# Altium footprint library Mechanical_Old.PcbLib: 125 footprints (part 6 of 8)
Each footprint in its own frame and in the unit in brackets; x right, y up, seen from the top. Pads: shape width x height; smd on the part's side, far side on the other; paste and mask are expansions set on the pad; w line width, h text height; cw(c..) or ccw(c..) is an arc to the next point about the centre after c.
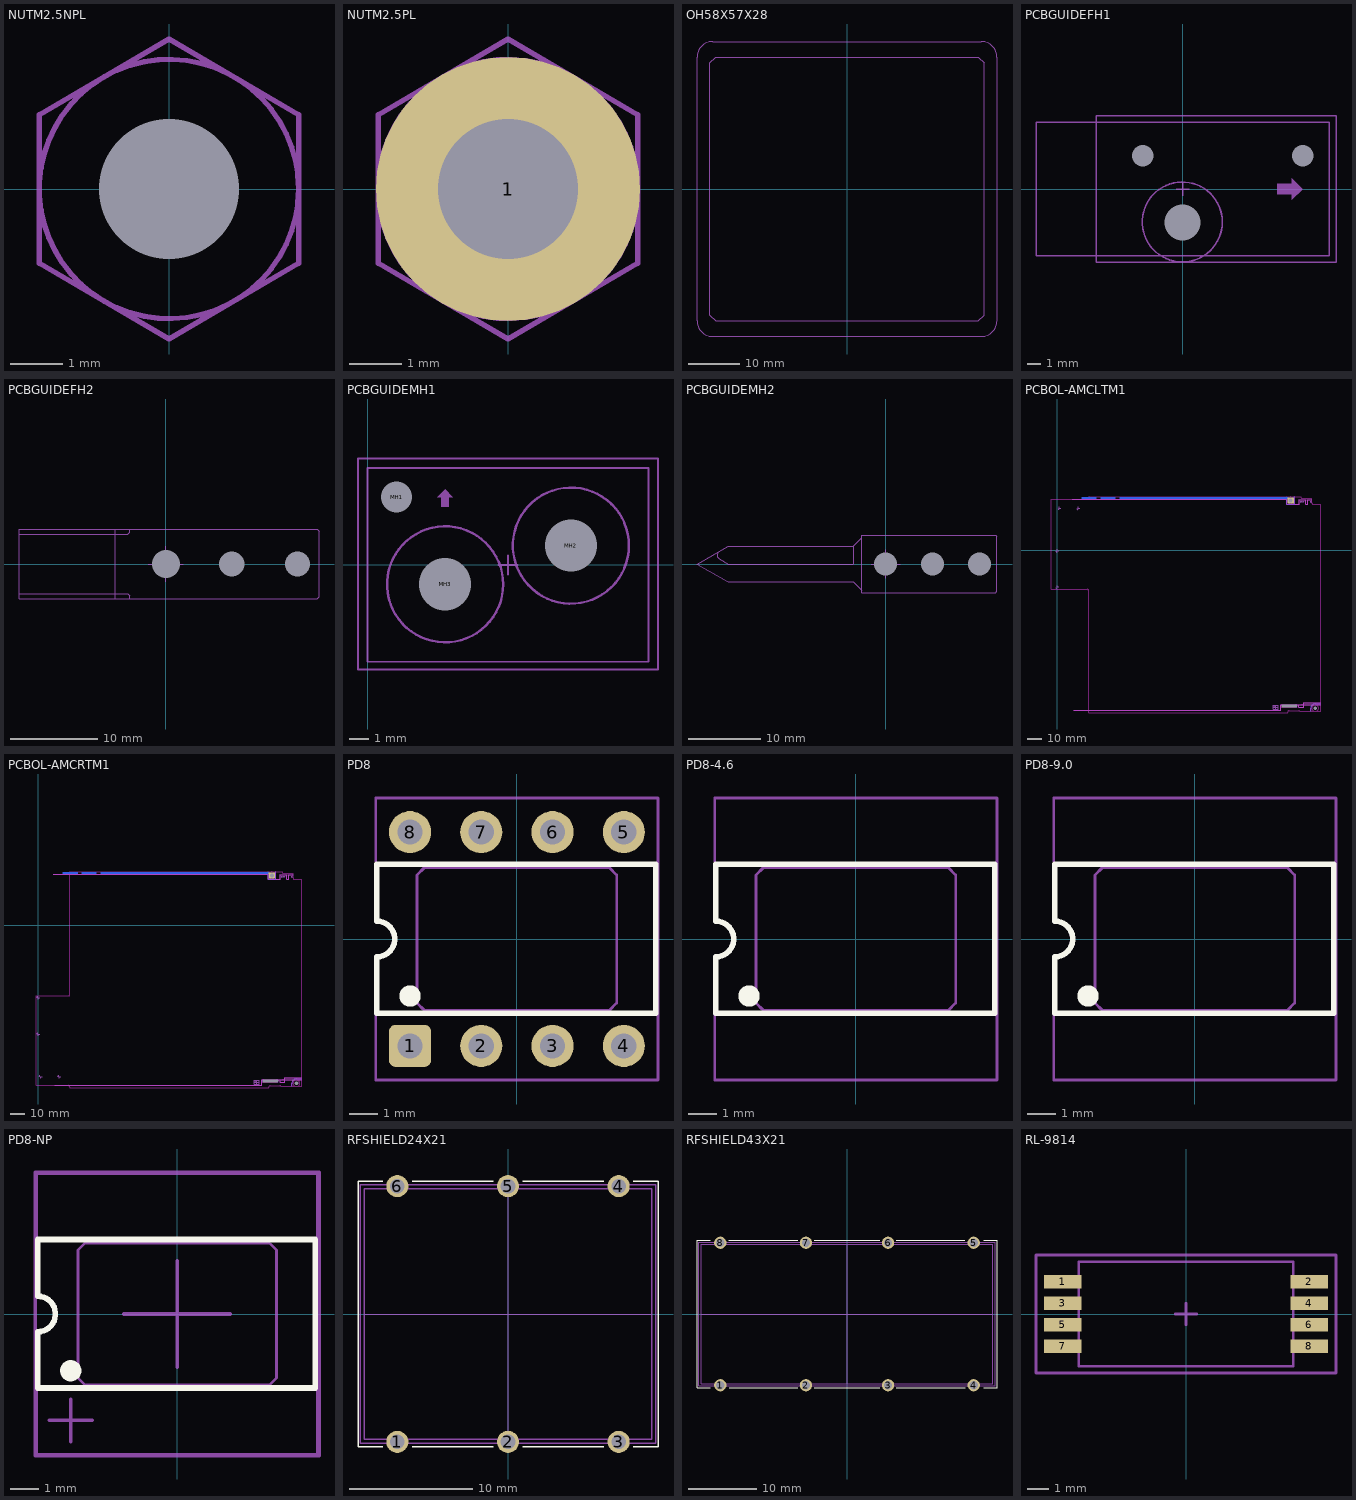
[diagram p5: the footprints below, top view; thin cyan lines are the x and y axes]

## NUTM2.5NPL [mm] "Nut M2.5 NON plated hole"
height 2
pads (1):
  round 0 hole 2.7 unplated mask+2.9: 1(0,0)
Mechanical 13:
  circle w0.102: c0,0 r2.5
  circle w0.102: c0,0 r1.25
  lines w0.102: -2.5,-1.432 -2.5,1.432 0,2.893 2.5,1.432 2.5,-1.432 0,-2.893 -2.5,-1.432
3D body: height 2, standoff 0, extent -2.5,-2.893 2.5,2.893

## NUTM2.5PL [mm] "Nut M2.5 plated hole"
height 2
pads (1):
  round 5.1 hole 2.7 mask+0.2: 1(0,0)
Mechanical 13:
  circle w0.102: c0,0 r2.5
  circle w0.102: c0,0 r1.25
  lines w0.102: -2.5,-1.432 -2.5,1.432 0,2.893 2.5,1.432 2.5,-1.432 0,-2.893 -2.5,-1.432
3D body: height 2, standoff 0, extent -2.5,-2.893 2.5,2.893

## OH58X57X28 [mm] "OH58X57X28 ABS"
height 28
Mechanical 2:
  lines w0.1: -26.5,-24.4 -26.5,24.4 -25.4,25.5 25.4,25.5 26.5,24.4 26.5,-24.4 25.4,-25.5 -25.4,-25.5 -26.5,-24.4
  lines w0.15: -29,-25.5 ccw(c-26,-25.5) -26,-28.5 26,-28.5 ccw(c26,-25.5) 29,-25.5 29,25.5 ccw(c26,25.5) 26,28.5 -26,28.5 ccw(c-26,25.5) -29,25.5 -29,-25.5

## PCBGUIDEFH1 [mm] "PCB guide female horizontal two pins"
height 14.5
pads (3):
  round 0.7 hole 1.6 unplated: MH1(-3,2.5) MH2(9,2.5)
  round 0 hole 2.7 unplated mask+3: MH3(0,-2.5)
Mechanical 13:
  region: 7.1,0.4 8.2,0.4 8.2,0.8 9,0 8.2,-0.8 8.2,-0.4 7.1,-0.4
  lines w0.102: -11,-5 -11,5 11,5 11,-5 -11,-5
Mechanical 15:
  circle w0.127: c-0.025,-2.475 r3
  lines w0.102: -0.5,0 0.5,0 ; 0,-0.5 0,0.5 ; -6.5,-5.5 -6.5,5.5 11.5,5.5 11.5,-5.5 -6.5,-5.5
3D body: height 14.51, standoff 14.5, extent 7.1,-0.8 9,0.8

## PCBGUIDEFH2 [mm] "PCB guide female horizontal one pin"
height 14.5
pads (3):
  round 0.7 hole 3.2 unplated: MH1(0,0)
  round 0.7 hole 2.9 unplated: MH2(15,0) MH3(7.5,0)
Mechanical 13:
  lines w0.1: -16.75,-3.4 -4.325,-3.4 -4.125,-3.6 -4.125,-3.95 ; -16.75,3.4 -4.325,3.4 -4.125,3.6 -4.125,3.95
  lines w0.102: -16.75,-3.95 17.25,-3.95 17.45,-3.75 17.45,3.75 17.25,3.95 -16.75,3.95 -16.75,-3.95
Mechanical 15:
  lines w0.1: -5.75,-3.95 -5.75,3.95
  lines w0.102: -2,0 2,0 ; 0,-2 0,2
3D body: height 9.72, standoff -1.98, extent -16.75,-3.95 17.45,3.95

## PCBGUIDEMH1 [mm] "PCB guide male vertical"
height 14.5
pads (3):
  round 0.7 hole 1.6 unplated: MH1(1.5,3.5)
  round 0.7 hole 2.7 unplated mask+3: MH2(10.5,1) MH3(4,-1)
Mechanical 13:
  region: 3.8,3 3.8,3.5 3.6,3.5 4,3.9 4.4,3.5 4.2,3.5 4.2,3
  lines w0.102: 0,-5 0,5 14.5,5 14.5,-5 0,-5
Mechanical 15:
  circle w0.127: c10.5,1 r3
  circle w0.127: c4,-1 r3
  lines w0.102: 6.75,0 7.75,0 ; 7.25,-0.5 7.25,0.5 ; -0.5,-5.4 15,-5.4 15,5.5 -0.5,5.5 -0.5,-5.4
3D body: height 0, standoff -2.5, extent 9.19,-0.314 11.812,2.309
3D body: height 0, standoff -2.5, extent 0.698,2.686 2.311,4.3
3D body: height 29.5, standoff 8.57, extent 8.988,-0.513 12.012,1.606
3D body: height 29.5, standoff 8.57, extent 2.488,-2.513 5.512,-0.394
3D body: height 8.57, standoff 7, extent 1.483,-3.491 6.507,1.534
3D body: height 8.57, standoff 7, extent 7.983,-1.491 13.007,3.534
3D body: height 7, standoff 0, extent 0,-5 14.5,5
3D body: height 7.01, standoff 7, extent 3.6,3 4.4,3.9

## PCBGUIDEMH2 [mm] "PCB guide male horizontal one pin"
height 14.5
pads (3):
  round 0.7 hole 3.2 unplated: MH1(0,0) MH2(12.96,0) MH3(6.48,0)
Mechanical 13:
  lines w0.1: -23.029,1.682 ccw(c-22.725,1.2) -23.01,0.707 -21.75,0 -4.475,0 -4.475,2.425 ; -3.3,-3.6 -4.475,-2.425 -21.75,-2.425 -26.075,0 -21.75,2.425 -4.475,2.425 ; -3.3,3.6 -4.475,2.425
  lines w0.102: -3.3,-3.95 -3.3,3.95 15.2,3.95 15.4,3.75 15.4,-3.75 15.2,-3.95 -3.3,-3.95
Mechanical 15:
  lines w0.1: -3.3,-3.95 -3.3,3.95
  lines w0.102: -2,0 2,0 ; 0,-2 0,2
3D body: height 9.72, standoff -3.98, extent -26.07,-3.95 15.4,3.95

## PCBOL-AMCLTM1 [mm] "AMC LTM module outline"
pads (11):
  oval 11x2 on Top Solder: 1(159.4,-106.95)
  oval 11x2 on Bottom Solder: 2(159.4,-106.95)
  rect 10x1 smd far side paste-3 mask-3: EP1(21.9,35.95) EP1(21.9,35.95) EP2(34.9,35.95) EP2(34.9,35.95)
  rect 115.5x1 smd far side paste-3 mask-3: EP3(100.65,35.95) EP3(100.65,35.95)
  rect 4.7x4.4 / inner round 0 / far side rect 4.7x4.4 hole 2.7 copper offset 0,-0.15 paste-2.54 mask+0.254: EP3(160.4,34.4)
  round 0 hole 2.7 unplated paste-2.54 mask+1.8: MH2(177.25,-108.5)
  round 0 hole 1.6 slot 10.6 at 0 deg unplated: MH3(159.4,-106.95)
Top Layer keep-out:
  lines w0.1: 157.8,36.75 157.8,31.8 166.2,31.8 166.2,34.9 175,34.9 ; 174.35,-110.65 174.35,-108.501 ; 176.065,-105.85 181,-105.85
  lines w0.102: 174.353,-108.494 cw(c177.26,-108.501) 176.065,-105.851
Bottom Layer keep-out:
  lines w0.1: 157.8,36.75 157.8,31.8 163.025,31.8 163.025,36.75
  lines w0.102: 174.25,-110.65 174.25,-108.493 cw(c177.25,-108.5) 177.25,-105.5 181,-105.5
Top Solder:
  region: 158.4,-110.1 11,-110.1 11,-111.9 158.4,-111.9
  region: 157.875,36.9 10.2,36.9 10.2,35.1 157.875,35.1
Bottom Solder:
  region: 157.875,36.9 10.2,36.9 10.2,35.1 157.875,35.1
  region: 158.4,-110.1 11,-110.1 11,-111.9 158.4,-111.9
Keep-Out Layer:
  lines w0.1: 20.5,-26.65 cw(c20.5,-27.65) 21.5,-27.65 ; 167.4,36.75 22,36.75 ccw(c22,36.25) 21.5,36.25 21.5,36 cw(c20.5,36) 20.5,35 -4.1,35 -4.1,-26.65 21.5,-26.65 21.5,-111.75 158.4,-111.75 158.4,-111.15 cw(c159.4,-111.15) 159.4,-110.15 165.784,-110.15 cw(c165.784,-111.15) 166.65,-110.65 181,-110.65 181,31.55 176,31.55 cw(c176,32.55) 175,32.55 175,35.75 168.4,35.75
Keep-Out Layer:
  circle w0.1: c160.4,34.4 r2.3
  lines w0.1: 167.4,36.75 ccw(c168.4,36.75) 168.4,35.75 ; 176.426,-110.647 cw(c177.25,-108.5) 178.074,-110.647 ; 154.4,-107.95 cw(c154.4,-106.95) 154.4,-105.95 163.9,-105.95 cw(c163.9,-106.95) 163.9,-107.95 154.4,-107.95
Mechanical 13 keep-out:
  lines w0.1: 10.2,35 157.8,35 157.8,31.8 166.2,31.8 166.2,34.9 170.8,34.9 170.8,31.8 172.1,31.8 172.1,34.9 175,34.9 ; 11.2,-110 153.4,-110 153.4,-106.55 154,-105.95 181,-105.95
Mechanical 14 keep-out:
  lines w0.1: 10.2,35 157.8,35 157.8,31.8 163,31.8 163,36.75 ; 11.2,-110 153.4,-110 153.4,-106.55 154,-105.95 166.05,-105.95 166.05,-107.975 169.2,-107.975 169.2,-104.8
  lines w0.102: 169.2,-104.8 181,-104.8
Mechanical 15:
  lines w0.1: 0,-24.15 0,-25.15 1,-25.15 ; 0,0.85 0,-0.15 1,-0.15 ; 1.5,30 1.5,29 2.5,29 ; 14.46,30 14.46,29 15.46,29 ; 150,-109.1 150,-106.3 148.25,-107.7 151.75,-107.7 ; 167.3,33.75 167.3,32.95 166.9,33.35 169.4,33.35 169,33.75 169,32.95 ; 168.15,32.95 168.15,33.75 ; 168.167,-106.4 168.167,-105.6 167.767,-106 168.567,-106 ; 174.25,33.725 174.25,32.925 173.85,33.325 174.65,33.325 ; -1,-25.55 -0.4,-25.55 -0.4,-26.15 -1,-25.55 ; -1,-25.55 -1,-25.55 ; -1,-0.55 -0.4,-1.15 -0.4,-0.55 -1,-0.55 ; -1,-0.55 -1,-0.55 ; 0.5,28.6 1.1,28.6 1.1,28 0.5,28.6 ; 0.5,28.6 0.5,28.6 ; 13.45,28.6 14.05,28.6 14.05,28 13.45,28.6 ; 13.45,28.6 13.45,28.6 ; 148.25,-109.1 148.25,-106.3 151.75,-106.3 151.75,-109.1 148.25,-109.1

## PCBOL-AMCRTM1 [mm] "AMC RTM module outline"
pads (11):
  oval 11x2 on Top Solder: 1(159.4,-106.95)
  oval 11x2 on Bottom Solder: 2(159.4,-106.95)
  rect 10x1 smd far side paste-3 mask-3: EP1(21.9,35.95) EP1(21.9,35.95) EP2(34.9,35.95) EP2(34.9,35.95)
  rect 115.5x1 smd far side paste-3 mask-3: EP3(100.65,35.95) EP3(100.65,35.95)
  rect 4.7x4.4 / inner round 0 / far side rect 4.7x4.4 hole 2.7 copper offset 0,-0.15 paste-2.54 mask+0.254: EP3(160.4,34.4)
  round 0 hole 2.7 unplated paste-2.54 mask+1.8: MH2(177.25,-108.5)
  round 0 hole 1.6 slot 10.6 at 0 deg unplated: MH3(159.4,-106.95)
Top Layer keep-out:
  lines w0.1: 157.8,36.75 157.8,31.8 166.2,31.8 166.2,34.9 175,34.9 ; 174.35,-110.65 174.35,-108.501 ; 176.065,-105.85 181,-105.85
  lines w0.102: 174.353,-108.494 cw(c177.26,-108.501) 176.065,-105.851
Bottom Layer keep-out:
  lines w0.1: 157.8,36.75 157.8,31.8 163.025,31.8 163.025,36.75
  lines w0.102: 174.25,-110.65 174.25,-108.493 cw(c177.25,-108.5) 177.25,-105.5 181,-105.5
Top Solder:
  region: 158.4,-110.1 11,-110.1 11,-111.9 158.4,-111.9
  region: 157.875,36.9 10.2,36.9 10.2,35.1 157.875,35.1
Bottom Solder:
  region: 157.875,36.9 10.2,36.9 10.2,35.1 157.875,35.1
  region: 158.4,-110.1 11,-110.1 11,-111.9 158.4,-111.9
Keep-Out Layer:
  lines w0.1: 20.5,-48.35 ccw(c20.5,-47.35) 21.5,-47.35 ; 167.4,36.75 21.5,36.75 21.5,-48.35 -1.5,-48.35 -1.5,-110 20.5,-110 cw(c20.5,-111) 21.5,-111 21.5,-111.25 ccw(c22,-111.25) 22,-111.75 158.4,-111.75 158.4,-111.15 cw(c159.4,-111.15) 159.4,-110.15 165.784,-110.15 cw(c165.784,-111.15) 166.65,-110.65 181,-110.65 181,31.55 176,31.55 cw(c176,32.55) 175,32.55 175,35.75 168.4,35.75
Keep-Out Layer:
  circle w0.1: c160.4,34.4 r2.3
  lines w0.1: 167.4,36.75 ccw(c168.4,36.75) 168.4,35.75 ; 176.426,-110.647 cw(c177.25,-108.5) 178.074,-110.647 ; 154.4,-107.95 cw(c154.4,-106.95) 154.4,-105.95 163.9,-105.95 cw(c163.9,-106.95) 163.9,-107.95 154.4,-107.95
Mechanical 13 keep-out:
  lines w0.1: 10.2,35 157.8,35 157.8,31.8 166.2,31.8 166.2,34.9 170.8,34.9 170.8,31.8 172.1,31.8 172.1,34.9 175,34.9 ; 11.2,-110 153.4,-110 153.4,-106.55 154,-105.95 181,-105.95
Mechanical 14 keep-out:
  lines w0.1: 10.2,35 157.8,35 157.8,31.8 163,31.8 163,36.75 ; 11.2,-110 153.4,-110 153.4,-106.55 154,-105.95 166.05,-105.95 166.05,-107.975 169.2,-107.975 169.2,-104.8
  lines w0.102: 169.2,-104.8 181,-104.8
Mechanical 15:
  lines w0.1: 0,-75.85 0,-74.85 1,-74.85 ; 0,-50.85 0,-49.85 1,-49.85 ; 1.5,-105 1.5,-104 2.5,-104 ; 14.46,-105 14.46,-104 15.46,-104 ; 150,-109.1 150,-106.3 148.25,-107.7 151.75,-107.7 ; 167.3,33.75 167.3,32.95 166.9,33.35 169.4,33.35 169,33.75 169,32.95 ; 168.15,32.95 168.15,33.75 ; 168.167,-106.4 168.167,-105.6 167.767,-106 168.567,-106 ; 174.25,33.725 174.25,32.925 173.85,33.325 174.65,33.325 ; -1,-74.45 -0.4,-73.85 -0.4,-74.45 -1,-74.45 ; -1,-74.45 -1,-74.45 ; -1,-49.45 -0.4,-49.45 -0.4,-48.85 -1,-49.45 ; -1,-49.45 -1,-49.45 ; 0.5,-103.6 1.1,-103.6 1.1,-103 0.5,-103.6 ; 0.5,-103.6 0.5,-103.6 ; 13.45,-103.6 14.05,-103.6 14.05,-103 13.45,-103.6 ; 13.45,-103.6 13.45,-103.6 ; 148.25,-109.1 148.25,-106.3 151.75,-106.3 151.75,-109.1 148.25,-109.1

## PD8 [mm] "DIL Socket 8pin E=7.62mm R2.54 mm"
height 2.5
pads (8):
  rrect30% 1.5x1.5 hole 0.9: 1(-3.81,-3.81)
  round 1.5 hole 0.9: 2(-1.27,-3.81) 3(1.27,-3.81) 4(3.81,-3.81) 5(3.81,3.81) 6(1.27,3.81) 7(-1.27,3.81) 8(-3.81,3.81)
Top Overlay:
  circle w0.4: c-3.81,-2.032 r0.18
  lines w0.2: -4.992,2.65 -4.992,0.635 cw(c-4.992,0) -4.992,-0.635 -4.992,-2.65 4.953,-2.65 4.953,2.667 -4.992,2.667
Mechanical 13:
  lines w0.1: -5.029,-5.029 -5.029,-0.635 ccw(c-5.029,0) -5.029,0.635 -5.029,5.029 5.029,5.029 5.029,-5.029 -5.029,-5.029 ; -3.556,-2.286 -3.302,-2.54 3.302,-2.54 3.556,-2.286 3.556,2.286 3.302,2.54 -3.302,2.54 -3.556,2.286 -3.556,-2.286
3D body: height 2.5, standoff 0.5, extent -5.029,-5.029 5.029,5.029
3D body: height 2.55, standoff 0, extent -4.826,-4.826 -2.802,-2.798
3D body: height 2.55, standoff 0, extent -2.286,-4.826 -0.262,-2.798
3D body: height 2.55, standoff 0, extent 0.254,-4.826 2.278,-2.798
3D body: height 2.55, standoff 0, extent 2.794,-4.826 4.818,-2.798
3D body: height 2.55, standoff 0, extent 2.802,2.798 4.826,4.826
3D body: height 2.55, standoff 0, extent 0.262,2.798 2.286,4.826
3D body: height 2.55, standoff 0, extent -2.278,2.798 -0.254,4.826
3D body: height 2.55, standoff 0, extent -4.818,2.798 -2.794,4.826
3D body: height 0, standoff -3, extent -4.191,-4.191 -3.432,-3.431
3D body: height 0, standoff -3, extent -1.651,-4.191 -0.892,-3.431
3D body: height 0, standoff -3, extent 0.889,-4.191 1.648,-3.431
3D body: height 0, standoff -3, extent 3.429,-4.191 4.188,-3.431
3D body: height 0, standoff -3, extent 3.429,3.429 4.188,4.189
3D body: height 0, standoff -3, extent 0.889,3.429 1.648,4.189
3D body: height 0, standoff -3, extent -1.651,3.429 -0.892,4.189
3D body: height 0, standoff -3, extent -4.191,3.429 -3.432,4.189

## PD8-4.6 [mm] "DIL Socket 8pin E=7.62mm R2.54 mm"
height 4.6
Top Overlay:
  circle w0.4: c-3.81,-2.032 r0.18
  lines w0.2: -4.992,2.65 -4.992,0.635 cw(c-4.992,0) -4.992,-0.635 -4.992,-2.65 4.953,-2.65 4.953,2.667 -4.992,2.667
Mechanical 13:
  lines w0.1: -5.029,-5.029 -5.029,-0.635 ccw(c-5.029,0) -5.029,0.635 -5.029,5.029 5.029,5.029 5.029,-5.029 -5.029,-5.029 ; -3.556,-2.286 -3.302,-2.54 3.302,-2.54 3.556,-2.286 3.556,2.286 3.302,2.54 -3.302,2.54 -3.556,2.286 -3.556,-2.286
3D body: height 4.6, standoff 0, extent -4.602,-4.607 -3.008,-3.01
3D body: height 4.6, standoff 0, extent -2.062,-4.607 -0.468,-3.01
3D body: height 4.6, standoff 0, extent 0.478,-4.607 2.072,-3.01
3D body: height 4.6, standoff 0, extent 3.018,-4.607 4.612,-3.01
3D body: height 4.6, standoff 0, extent 3.018,3.013 4.612,4.61
3D body: height 4.6, standoff 0, extent 0.478,3.013 2.072,4.61
3D body: height 4.6, standoff 0, extent -2.062,3.013 -0.468,4.61
3D body: height 4.59, standoff 1.6, extent -5.029,-5.029 5.029,5.029
3D body: height 4.6, standoff 0, extent -4.602,3.013 -3.008,4.61
3D body: height 0, standoff -3, extent -4.191,-4.191 -3.432,-3.431
3D body: height 0, standoff -3, extent -1.651,-4.191 -0.892,-3.431
3D body: height 0, standoff -3, extent 0.889,-4.191 1.648,-3.431
3D body: height 0, standoff -3, extent 3.429,-4.191 4.188,-3.431
3D body: height 0, standoff -3, extent 3.429,3.429 4.188,4.189
3D body: height 0, standoff -3, extent 0.889,3.429 1.648,4.189
3D body: height 0, standoff -3, extent -1.651,3.429 -0.892,4.189
3D body: height 0, standoff -3, extent -4.191,3.429 -3.432,4.189

## PD8-9.0 [mm] "DIL Socket 8pin E=7.62mm R2.54 mm"
height 9
Top Overlay:
  circle w0.4: c-3.81,-2.032 r0.18
  lines w0.2: -4.992,2.65 -4.992,0.635 cw(c-4.992,0) -4.992,-0.635 -4.992,-2.65 4.953,-2.65 4.953,2.667 -4.992,2.667
Mechanical 13:
  lines w0.1: -5.029,-5.029 5.029,-5.029 5.029,5.029 -5.029,5.029 -5.029,0.635 cw(c-5.029,0) -5.029,-0.635 -5.029,-5.029 ; -3.556,-2.286 -3.556,2.286 -3.302,2.54 3.302,2.54 3.556,2.286 3.556,-2.286 3.302,-2.54 -3.302,-2.54 -3.556,-2.286
3D body: height 9.1, standoff 4.5, extent -4.602,-4.607 -3.008,-3.01
3D body: height 9.1, standoff 4.5, extent -2.062,-4.607 -0.468,-3.01
3D body: height 9.1, standoff 4.5, extent 0.478,-4.607 2.072,-3.01
3D body: height 9.1, standoff 4.5, extent 3.018,-4.607 4.612,-3.01
3D body: height 9.1, standoff 4.5, extent 3.018,3.013 4.612,4.61
3D body: height 9.1, standoff 4.5, extent 0.478,3.013 2.072,4.61
3D body: height 9.1, standoff 4.5, extent -2.062,3.013 -0.468,4.61
3D body: height 9.1, standoff 4.5, extent -4.602,3.013 -3.008,4.61
3D body: height 8.99, standoff 6, extent -5.029,-5.029 5.029,5.029

## PD8-NP [mm] "DIL Socket 8pin E=7.62mm R2.54 mm without pads"
height 2.5
Top Overlay:
  circle w0.4: c-3.81,-2.032 r0.18
  lines w0.2: -4.992,2.65 -4.992,0.635 cw(c-4.992,0) -4.992,-0.635 -4.992,-2.65 4.953,-2.65 4.953,2.667 -4.992,2.667
Mechanical 13:
  lines w0.1: -5.029,-5.029 5.029,-5.029 5.029,5.029 -5.029,5.029 -5.029,0.635 cw(c-5.029,0) -5.029,-0.635 -5.029,-5.029 ; -3.556,-2.286 -3.556,2.286 -3.302,2.54 3.302,2.54 3.556,2.286 3.556,-2.286 3.302,-2.54 -3.302,-2.54 -3.556,-2.286
Mechanical 15:
  lines w0.127: -4.572,-3.81 -3.048,-3.81 ; -3.81,-4.572 -3.81,-3.048 ; -1.905,0 1.905,0 ; 0,-1.905 0,1.905 ; -5.08,-5.08 5.08,-5.08 5.08,5.08 -5.08,5.08 -5.08,-5.08
3D body: height 0, standoff -3, extent -4.191,3.429 -3.432,4.189
3D body: height 0, standoff -3, extent -1.651,3.429 -0.892,4.189
3D body: height 0, standoff -3, extent 0.889,3.429 1.648,4.189
3D body: height 0, standoff -3, extent 3.429,3.429 4.188,4.189
3D body: height 0, standoff -3, extent 3.429,-4.191 4.188,-3.431
3D body: height 0, standoff -3, extent 0.889,-4.191 1.648,-3.431
3D body: height 0, standoff -3, extent -1.651,-4.191 -0.892,-3.431
3D body: height 0, standoff -3, extent -4.191,-4.191 -3.432,-3.431
3D body: height 2.55, standoff 0, extent -4.818,2.798 -2.794,4.826
3D body: height 2.55, standoff 0, extent -2.278,2.798 -0.254,4.826
3D body: height 2.55, standoff 0, extent 0.262,2.798 2.286,4.826
3D body: height 2.55, standoff 0, extent 2.802,2.798 4.826,4.826
3D body: height 2.55, standoff 0, extent 2.794,-4.826 4.818,-2.798
3D body: height 2.55, standoff 0, extent 0.254,-4.826 2.278,-2.798
3D body: height 2.55, standoff 0, extent -2.286,-4.826 -0.262,-2.798
3D body: height 2.55, standoff 0, extent -4.826,-4.826 -2.802,-2.798
3D body: height 2.5, standoff 0.5, extent -5.029,-5.029 5.029,5.029

## RFSHIELD24X21 [mm] "RF shield 24x21x7mm 6 solder pin"
height 7
pads (6):
  round 1.8 hole 1.2: 1(-9,-10.4) 2(0,-10.4) 3(9,-10.4) 4(9,10.4) 5(0,10.4) 6(-9,10.4)
Top Overlay:
  lines w0.102: -10.2,-10.8 -12.2,-10.8 -12.2,10.8 -10.2,10.8 ; -7.8,-10.8 -1.2,-10.8 ; -7.8,10.8 -1.2,10.8 ; 1.2,-10.8 7.8,-10.8 ; 1.2,10.8 7.8,10.8 ; 10.2,-10.8 12.2,-10.8 12.2,10.8 10.2,10.8
Mechanical 13:
  lines w0.102: -12,-10.5 12,-10.5 12,10.5 -12,10.5 -12,-10.5 ; -11.7,-10.2 11.7,-10.2 11.7,10.2 -11.7,10.2 -11.7,-10.2
Mechanical 15:
  lines w0.1: -11.7,0 11.7,0 ; 0,-10.2 0,10.2
3D body: height 7, standoff 0, extent -12,-10.5 12,10.5
3D body: height 7, standoff 6.7, extent -12,-10.5 12,10.5

## RFSHIELD43X21 [mm] "RF shield 42.5x21x7mm 8 solder pin"
height 7
pads (8):
  round 1.8 hole 1.2: 1(-18.5,-10.4) 2(-6,-10.4) 3(6,-10.4) 4(18.5,-10.4) 5(18.5,10.4) 6(6,10.4) 7(-6,10.4) 8(-18.5,10.4)
Top Overlay:
  lines w0.102: -20,-10.8 -21.9,-10.8 -21.9,10.8 -20,10.8 ; -17.3,10.8 -7.2,10.8 ; -17.2,-10.8 -7.2,-10.8 ; -4.8,-10.8 4.8,-10.8 ; -4.8,10.8 4.8,10.8 ; 7.2,-10.8 17.3,-10.8 ; 7.2,10.8 17.2,10.8 ; 20,-10.8 21.9,-10.8 21.9,10.8 20,10.8
Mechanical 13:
  lines w0.102: -21.65,-10.5 -21.65,10.5 21.65,10.5 21.65,-10.5 -21.65,-10.5 ; -21.3,-10.2 -21.3,10.2 21.3,10.2 21.3,-10.2 -21.3,-10.2
Mechanical 15:
  lines w0.1: -21.3,0 21.3,0 ; 0,-10.2 0,10.2
3D body: height 7, standoff 6.7, extent -21.65,-10.5 21.65,10.5
3D body: height 7, standoff 0, extent -21.65,-10.5 21.65,10.5

## RL-9814 [mil] "Reed Relay 9814 series"
height 180
pads (8):
  rect 70x25 smd: 1(-230,60.24) 2(230,60.24) 3(-230,20.08) 4(230,20.08) 5(-230,-20.08) 6(230,-20.08) 7(-230,-60.24) 8(230,-60.24)
Mechanical 13:
  lines w5: -200,-97.5 -200,97.5 200,97.5 200,-97.5 -200,-97.5
Mechanical 15:
  lines w5: -20,0 20,0 ; 0,-20 0,20 ; -280,-110 -280,110 280,110 280,-110 -280,-110
3D body: height 180, standoff 0, extent -200,-97.44 200,97.44
3D body: height 180.39, standoff 180, extent -179.21,40.35 -140,79.65